# Altium footprint library SAMTEC THD.PcbLib: 161 footprints (part 10 of 12)
Each footprint in its own frame and in the unit in brackets; x right, y up, seen from the top. Pads: shape width x height; smd on the part's side, far side on the other; paste and mask are expansions set on the pad; w line width, h text height; cw(c..) or ccw(c..) is an arc to the next point about the centre after c.
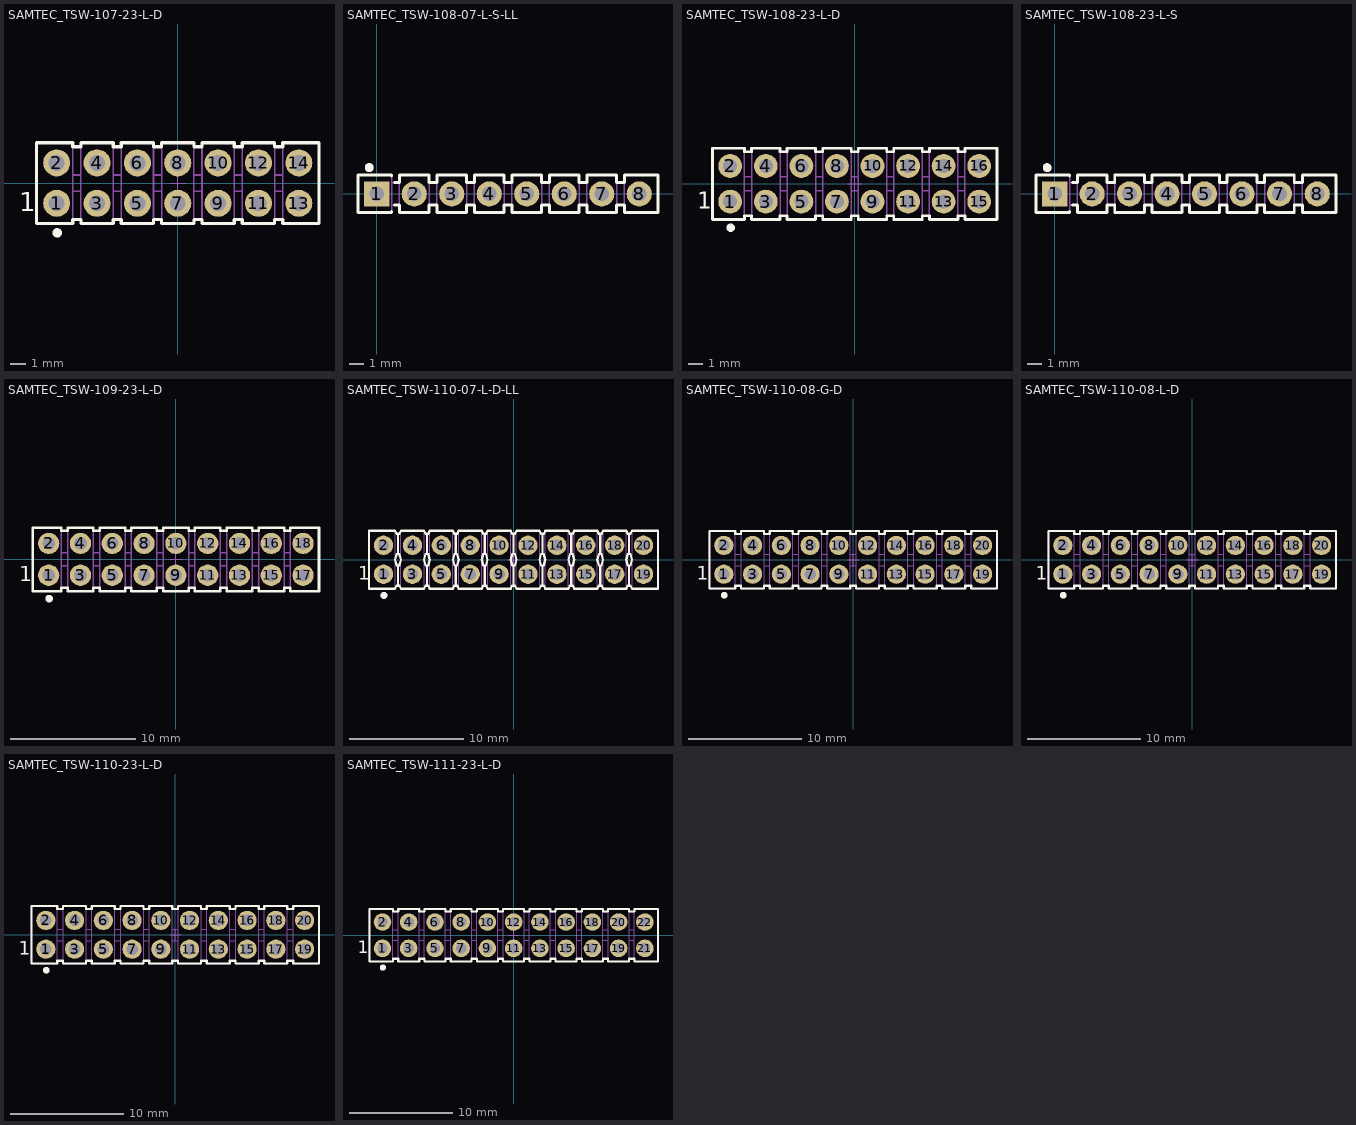
[diagram p9: the footprints below, top view; thin cyan lines are the x and y axes]

## SAMTEC_TSW-107-23-L-D [mm] "14 Contacts - Pitch 2.54mm - Dual Row  Through Mount Straigh Header (Post Lead 5.84mm, Tail Lead 2.92mm, Insulator 2.54mm)"
height 8.38
pads (14):
  round 1.7 hole 1: 1(-7.62,-1.27) 2(-7.62,1.27) 3(-5.08,-1.27) 4(-5.08,1.27) 5(-2.54,-1.27) 6(-2.54,1.27) 7(0,-1.27) 8(0,1.27) 9(2.54,-1.27) 10(2.54,1.27) 11(5.08,-1.27) 12(5.08,1.27) 13(7.62,-1.27) 14(7.62,1.27)
Top Overlay:
  circle w0.3: c-7.585,-3.135 r0.15
  lines w0.2: -8.89,-2.54 -6.604,-2.54 -6.604,-2.286 -6.096,-2.286 -6.096,-2.54 -4.064,-2.54 -4.064,-2.286 -3.556,-2.286 -3.556,-2.54 -1.524,-2.54 -1.524,-2.286 -1.016,-2.286 -1.016,-2.54 1.016,-2.54 1.016,-2.286 1.524,-2.286 1.524,-2.54 3.556,-2.54 3.556,-2.286 4.064,-2.286 4.064,-2.54 6.096,-2.54 6.096,-2.286 6.604,-2.286 6.604,-2.54 8.89,-2.54 8.89,2.54 6.604,2.54 6.604,2.286 6.096,2.286 6.096,2.54 4.064,2.54 4.064,2.286 3.556,2.286 3.556,2.54 1.524,2.54 1.524,2.286 1.016,2.286 1.016,2.54 -1.016,2.54 -1.016,2.286 -1.524,2.286 -1.524,2.54 -3.556,2.54 -3.556,2.286 -4.064,2.286 -4.064,2.54 -6.096,2.54 -6.096,2.286 -6.604,2.286 -6.604,2.54 -8.89,2.54 -8.89,-2.54
  text "1" at -9.992,-1.768 h1.2
Mechanical 8:
  lines w0.05: -8.12,-1.27 -7.62,-1.27 ; -8.12,1.27 -7.62,1.27 ; -7.62,-1.77 -7.62,-1.27 ; -7.62,-0.77 -7.62,-1.27 ; -7.62,0.77 -7.62,1.27 ; -7.62,1.77 -7.62,1.27 ; -7.12,-1.27 -7.62,-1.27 ; -7.12,1.27 -7.62,1.27 ; -5.58,-1.27 -5.08,-1.27 ; -5.58,1.27 -5.08,1.27 ; -5.08,-1.77 -5.08,-1.27 ; -5.08,-0.77 -5.08,-1.27 ; -5.08,0.77 -5.08,1.27 ; -5.08,1.77 -5.08,1.27 ; -4.58,-1.27 -5.08,-1.27 ; -4.58,1.27 -5.08,1.27 ; -3.04,-1.27 -2.54,-1.27 ; -3.04,1.27 -2.54,1.27 ; -2.54,-1.77 -2.54,-1.27 ; -2.54,-0.77 -2.54,-1.27 ; -2.54,0.77 -2.54,1.27 ; -2.54,1.77 -2.54,1.27 ; -2.04,-1.27 -2.54,-1.27 ; -2.04,1.27 -2.54,1.27 ; -0.5,-1.27 0,-1.27 ; -0.5,0 0,0 ; -0.5,1.27 0,1.27 ; 0,-1.77 0,-1.27 ; 0,-0.77 0,-1.27 ; 0,-0.5 0,0 ; 0,0.5 0,0 ; 0,0.77 0,1.27 ; 0,1.77 0,1.27 ; 0.5,-1.27 0,-1.27 ; 0.5,0 0,0 ; 0.5,1.27 0,1.27 ; 2.04,-1.27 2.54,-1.27 ; 2.04,1.27 2.54,1.27 ; 2.54,-1.77 2.54,-1.27 ; 2.54,-0.77 2.54,-1.27 ; 2.54,0.77 2.54,1.27 ; 2.54,1.77 2.54,1.27 ; 3.04,-1.27 2.54,-1.27 ; 3.04,1.27 2.54,1.27 ; 4.58,-1.27 5.08,-1.27 ; 4.58,1.27 5.08,1.27 ; 5.08,-1.77 5.08,-1.27 ; 5.08,-0.77 5.08,-1.27 ; 5.08,0.77 5.08,1.27 ; 5.08,1.77 5.08,1.27 ; 5.58,-1.27 5.08,-1.27 ; 5.58,1.27 5.08,1.27 ; 7.12,-1.27 7.62,-1.27 ; 7.12,1.27 7.62,1.27 ; 7.62,-1.77 7.62,-1.27 ; 7.62,-0.77 7.62,-1.27 ; 7.62,0.77 7.62,1.27 ; 7.62,1.77 7.62,1.27 ; 8.12,-1.27 7.62,-1.27 ; 8.12,1.27 7.62,1.27
Mechanical 14:
  lines w0.1: -6.604,-2.286 -6.096,-2.286 ; -6.604,-0.508 -6.096,-0.508 ; -6.604,0.508 -6.096,0.508 ; -6.604,2.286 -6.096,2.286 ; -4.064,-2.286 -3.556,-2.286 ; -4.064,-0.508 -3.556,-0.508 ; -4.064,0.508 -3.556,0.508 ; -4.064,2.286 -3.556,2.286 ; -1.524,-2.286 -1.016,-2.286 ; -1.524,-0.508 -1.016,-0.508 ; -1.524,0.508 -1.016,0.508 ; -1.524,2.286 -1.016,2.286 ; 1.016,-2.286 1.524,-2.286 ; 1.016,-0.508 1.524,-0.508 ; 1.016,0.508 1.524,0.508 ; 1.016,2.286 1.524,2.286 ; 3.556,-2.286 4.064,-2.286 ; 3.556,-0.508 4.064,-0.508 ; 3.556,0.508 4.064,0.508 ; 3.556,2.286 4.064,2.286 ; 6.096,-2.286 6.604,-2.286 ; 6.096,-0.508 6.604,-0.508 ; 6.096,0.508 6.604,0.508 ; 6.096,2.286 6.604,2.286 ; -8.89,-2.54 -8.89,2.54 -6.604,2.54 -6.604,-2.54 -8.89,-2.54 ; -6.096,-2.54 -6.096,2.54 -4.064,2.54 -4.064,-2.54 -6.096,-2.54 ; -3.556,-2.54 -3.556,2.54 -1.524,2.54 -1.524,-2.54 -3.556,-2.54 ; -1.016,-2.54 -1.016,2.54 1.016,2.54 1.016,-2.54 -1.016,-2.54 ; 1.524,-2.54 1.524,2.54 3.556,2.54 3.556,-2.54 1.524,-2.54 ; 4.064,-2.54 4.064,2.54 6.096,2.54 6.096,-2.54 4.064,-2.54 ; 6.604,-2.54 6.604,2.54 8.89,2.54 8.89,-2.54 6.604,-2.54
3D body "SAMTEC_TSW-107-23-L-D.stp": height 8.38, standoff -2.92, extent -8.89,-2.54 8.89,2.54

## SAMTEC_TSW-108-07-L-S-LL [mm] "8 Contacts - Pitch 2.54mm - Single Row  Through Mount Straigh Header (Post Lead 5.84mm, Tail Lead 2.54mm, Insulator 2.54mm)"
height 8.38
pads (8):
  rect 1.7x1.7 hole 1: 1(0,0)
  round 1.7 hole 1: 2(2.54,0) 3(5.08,0) 4(7.62,0) 5(10.16,0) 6(12.7,0) 7(15.24,0) 8(17.78,0)
Top Overlay:
  circle w0.3: c-0.508,1.778 r0.15
  lines w0.2: 1.007,-1.2 1.007,-1.27 -1.27,-1.27 -1.27,1.27 1.007,1.27 1.007,1.2 ; 1.2,-0.762 1.533,-0.762 1.533,-1.27 3.547,-1.27 3.547,-0.762 4.073,-0.762 4.073,-1.27 6.087,-1.27 6.087,-0.762 6.613,-0.762 6.613,-1.27 8.627,-1.27 8.627,-0.762 9.153,-0.762 9.153,-1.27 11.167,-1.27 11.167,-0.762 11.693,-0.762 11.693,-1.27 13.707,-1.27 13.707,-0.762 14.233,-0.762 14.233,-1.27 16.247,-1.27 16.247,-0.762 ; 1.2,0.762 1.533,0.762 1.533,1.27 3.547,1.27 3.547,0.762 4.073,0.762 4.073,1.27 6.087,1.27 6.087,0.762 6.613,0.762 6.613,1.27 8.627,1.27 8.627,0.762 9.153,0.762 9.153,1.27 11.167,1.27 11.167,0.762 11.693,0.762 11.693,1.27 13.707,1.27 13.707,0.762 14.233,0.762 14.233,1.27 16.247,1.27 16.247,0.762 ; 16.247,-0.762 16.773,-0.762 ; 16.247,-0.762 16.773,-0.762 ; 16.247,0.762 16.773,0.762 ; 16.247,0.762 16.773,0.762 ; 16.773,-0.762 16.773,-1.27 19.05,-1.27 19.05,1.27 16.773,1.27 16.773,0.762
Mechanical 8:
  lines w0.1: -0.5,0 0,0 ; 0,-0.5 0,0 ; 0,0.5 0,0 ; 0.5,0 0,0 ; 2.04,0 2.54,0 ; 2.54,-0.5 2.54,0 ; 2.54,0.5 2.54,0 ; 3.04,0 2.54,0 ; 4.58,0 5.08,0 ; 5.08,-0.5 5.08,0 ; 5.08,0.5 5.08,0 ; 5.58,0 5.08,0 ; 7.12,0 7.62,0 ; 7.62,-0.5 7.62,0 ; 7.62,0.5 7.62,0 ; 8.12,0 7.62,0 ; 9.66,0 10.16,0 ; 10.16,-0.5 10.16,0 ; 10.16,0.5 10.16,0 ; 10.66,0 10.16,0 ; 12.2,0 12.7,0 ; 12.7,-0.5 12.7,0 ; 12.7,0.5 12.7,0 ; 13.2,0 12.7,0 ; 14.74,0 15.24,0 ; 15.24,-0.5 15.24,0 ; 15.24,0.5 15.24,0 ; 15.74,0 15.24,0 ; 17.28,0 17.78,0 ; 17.78,-0.5 17.78,0 ; 17.78,0.5 17.78,0 ; 18.28,0 17.78,0
Mechanical 14:
  circle w0.3: c-0.508,1.778 r0.15
  lines w0.1: 1.007,-0.762 1.533,-0.762 ; 1.007,0.762 1.533,0.762 ; 3.547,-0.762 4.073,-0.762 ; 3.547,0.762 4.073,0.762 ; 6.087,-0.762 6.613,-0.762 ; 6.087,0.762 6.613,0.762 ; 8.627,-0.762 9.153,-0.762 ; 8.627,0.762 9.153,0.762 ; 11.167,-0.762 11.693,-0.762 ; 11.167,0.762 11.693,0.762 ; 13.707,-0.762 14.233,-0.762 ; 13.707,0.762 14.233,0.762 ; -1.27,-1.27 -1.27,1.27 1.007,1.27 1.007,-1.27 -1.27,-1.27 ; -0.317,-0.318 -0.318,0.317 0.317,0.317 0.318,-0.317 -0.317,-0.318 ; 1.533,-1.27 3.547,-1.27 3.547,1.27 1.533,1.27 1.533,-1.27 ; 2.223,-0.318 2.222,0.317 2.857,0.317 2.858,-0.317 2.223,-0.318 ; 4.073,-1.27 4.073,1.27 6.087,1.27 6.087,-1.27 4.073,-1.27 ; 4.763,-0.318 5.398,-0.318 5.397,0.317 4.763,0.317 4.763,-0.318 ; 6.613,-1.27 6.613,1.27 8.627,1.27 8.627,-1.27 6.613,-1.27 ; 7.303,-0.318 7.938,-0.318 7.937,0.317 7.303,0.317 7.303,-0.318 ; 9.153,-1.27 9.153,1.27 11.167,1.27 11.167,-1.27 9.153,-1.27 ; 9.843,-0.318 10.478,-0.318 10.477,0.317 9.843,0.317 9.843,-0.318 ; 11.693,-1.27 11.693,1.27 13.707,1.27 13.707,-1.27 11.693,-1.27 ; 12.383,-0.318 13.018,-0.318 13.017,0.317 12.383,0.317 12.383,-0.318 ; 14.233,-1.27 14.233,1.27 16.247,1.27 16.247,-1.27 14.233,-1.27 ; 14.923,-0.318 14.923,0.317 15.557,0.317 15.558,-0.317 14.923,-0.318 ; 16.247,-0.762 16.773,-0.762 16.247,-0.762 ; 16.247,0.762 16.773,0.762 16.247,0.762 ; 16.773,-1.27 16.773,1.27 19.05,1.27 19.05,-1.27 16.773,-1.27 ; 17.463,-0.318 17.463,0.317 18.098,0.317 18.098,-0.318 17.463,-0.318
3D body "SAMTEC_TSW-108-07-L-S-LL.stp": height 8.38, standoff -2.54, extent -1.27,-1.27 19.05,1.27

## SAMTEC_TSW-108-23-L-D [mm] "16 Contacts - Pitch 2.54mm - Dual Row  Through Mount Straigh Header (Post Lead 5.84mm, Tail Lead 2.92mm, Insulator 2.54mm)"
height 8.38
pads (16):
  round 1.7 hole 1: 1(-8.89,-1.27) 2(-8.89,1.27) 3(-6.35,-1.27) 4(-6.35,1.27) 5(-3.81,-1.27) 6(-3.81,1.27) 7(-1.27,-1.27) 8(-1.27,1.27) 9(1.27,-1.27) 10(1.27,1.27) 11(3.81,-1.27) 12(3.81,1.27) 13(6.35,-1.27) 14(6.35,1.27) 15(8.89,-1.27) 16(8.89,1.27)
Top Overlay:
  circle w0.3: c-8.855,-3.135 r0.15
  lines w0.2: -10.16,-2.54 -7.874,-2.54 -7.874,-2.286 -7.366,-2.286 -7.366,-2.54 -5.334,-2.54 -5.334,-2.286 -4.826,-2.286 -4.826,-2.54 -2.794,-2.54 -2.794,-2.286 -2.286,-2.286 -2.286,-2.54 -0.254,-2.54 -0.254,-2.286 0.254,-2.286 0.254,-2.54 2.286,-2.54 2.286,-2.286 2.794,-2.286 2.794,-2.54 4.826,-2.54 4.826,-2.286 5.334,-2.286 5.334,-2.54 7.366,-2.54 7.366,-2.286 7.874,-2.286 7.874,-2.54 10.16,-2.54 10.16,2.54 7.874,2.54 7.874,2.286 7.366,2.286 7.366,2.54 5.334,2.54 5.334,2.286 4.826,2.286 4.826,2.54 2.794,2.54 2.794,2.286 2.286,2.286 2.286,2.54 0.254,2.54 0.254,2.286 -0.254,2.286 -0.254,2.54 -2.286,2.54 -2.286,2.286 -2.794,2.286 -2.794,2.54 -4.826,2.54 -4.826,2.286 -5.334,2.286 -5.334,2.54 -7.366,2.54 -7.366,2.286 -7.874,2.286 -7.874,2.54 -10.16,2.54 -10.16,-2.54
  text "1" at -11.262,-1.768 h1.2
Mechanical 8:
  lines w0.05: -9.39,-1.27 -8.89,-1.27 ; -9.39,1.27 -8.89,1.27 ; -8.89,-1.77 -8.89,-1.27 ; -8.89,-0.77 -8.89,-1.27 ; -8.89,0.77 -8.89,1.27 ; -8.89,1.77 -8.89,1.27 ; -8.39,-1.27 -8.89,-1.27 ; -8.39,1.27 -8.89,1.27 ; -6.85,-1.27 -6.35,-1.27 ; -6.85,1.27 -6.35,1.27 ; -6.35,-1.77 -6.35,-1.27 ; -6.35,-0.77 -6.35,-1.27 ; -6.35,0.77 -6.35,1.27 ; -6.35,1.77 -6.35,1.27 ; -5.85,-1.27 -6.35,-1.27 ; -5.85,1.27 -6.35,1.27 ; -4.31,-1.27 -3.81,-1.27 ; -4.31,1.27 -3.81,1.27 ; -3.81,-1.77 -3.81,-1.27 ; -3.81,-0.77 -3.81,-1.27 ; -3.81,0.77 -3.81,1.27 ; -3.81,1.77 -3.81,1.27 ; -3.31,-1.27 -3.81,-1.27 ; -3.31,1.27 -3.81,1.27 ; -1.77,-1.27 -1.27,-1.27 ; -1.77,1.27 -1.27,1.27 ; -1.27,-1.77 -1.27,-1.27 ; -1.27,-0.77 -1.27,-1.27 ; -1.27,0.77 -1.27,1.27 ; -1.27,1.77 -1.27,1.27 ; -0.77,-1.27 -1.27,-1.27 ; -0.77,1.27 -1.27,1.27 ; -0.5,0 0,0 ; 0,-0.5 0,0 ; 0,0.5 0,0 ; 0.5,0 0,0 ; 0.77,-1.27 1.27,-1.27 ; 0.77,1.27 1.27,1.27 ; 1.27,-1.77 1.27,-1.27 ; 1.27,-0.77 1.27,-1.27 ; 1.27,0.77 1.27,1.27 ; 1.27,1.77 1.27,1.27 ; 1.77,-1.27 1.27,-1.27 ; 1.77,1.27 1.27,1.27 ; 3.31,-1.27 3.81,-1.27 ; 3.31,1.27 3.81,1.27 ; 3.81,-1.77 3.81,-1.27 ; 3.81,-0.77 3.81,-1.27 ; 3.81,0.77 3.81,1.27 ; 3.81,1.77 3.81,1.27 ; 4.31,-1.27 3.81,-1.27 ; 4.31,1.27 3.81,1.27 ; 5.85,-1.27 6.35,-1.27 ; 5.85,1.27 6.35,1.27 ; 6.35,-1.77 6.35,-1.27 ; 6.35,-0.77 6.35,-1.27 ; 6.35,0.77 6.35,1.27 ; 6.35,1.77 6.35,1.27 ; 6.85,-1.27 6.35,-1.27 ; 6.85,1.27 6.35,1.27 ; 8.39,-1.27 8.89,-1.27 ; 8.39,1.27 8.89,1.27 ; 8.89,-1.77 8.89,-1.27 ; 8.89,-0.77 8.89,-1.27 ; 8.89,0.77 8.89,1.27 ; 8.89,1.77 8.89,1.27 ; 9.39,-1.27 8.89,-1.27 ; 9.39,1.27 8.89,1.27
Mechanical 14:
  lines w0.1: -7.874,-2.286 -7.366,-2.286 ; -7.874,-0.508 -7.366,-0.508 ; -7.874,0.508 -7.366,0.508 ; -7.874,2.286 -7.366,2.286 ; -5.334,-2.286 -4.826,-2.286 ; -5.334,-0.508 -4.826,-0.508 ; -5.334,0.508 -4.826,0.508 ; -5.334,2.286 -4.826,2.286 ; -2.794,-2.286 -2.286,-2.286 ; -2.794,-0.508 -2.286,-0.508 ; -2.794,0.508 -2.286,0.508 ; -2.794,2.286 -2.286,2.286 ; -0.254,-2.286 0.254,-2.286 ; -0.254,-0.508 0.254,-0.508 ; -0.254,0.508 0.254,0.508 ; -0.254,2.286 0.254,2.286 ; 2.286,-2.286 2.794,-2.286 ; 2.286,-0.508 2.794,-0.508 ; 2.286,0.508 2.794,0.508 ; 2.286,2.286 2.794,2.286 ; 4.826,-2.286 5.334,-2.286 ; 4.826,-0.508 5.334,-0.508 ; 4.826,0.508 5.334,0.508 ; 4.826,2.286 5.334,2.286 ; 7.366,-2.286 7.874,-2.286 ; 7.366,-0.508 7.874,-0.508 ; 7.366,0.508 7.874,0.508 ; 7.366,2.286 7.874,2.286 ; -10.16,-2.54 -10.16,2.54 -7.874,2.54 -7.874,-2.54 -10.16,-2.54 ; -7.366,-2.54 -7.366,2.54 -5.334,2.54 -5.334,-2.54 -7.366,-2.54 ; -4.826,-2.54 -4.826,2.54 -2.794,2.54 -2.794,-2.54 -4.826,-2.54 ; -2.286,-2.54 -2.286,2.54 -0.254,2.54 -0.254,-2.54 -2.286,-2.54 ; 0.254,-2.54 0.254,2.54 2.286,2.54 2.286,-2.54 0.254,-2.54 ; 2.794,-2.54 2.794,2.54 4.826,2.54 4.826,-2.54 2.794,-2.54 ; 5.334,-2.54 5.334,2.54 7.366,2.54 7.366,-2.54 5.334,-2.54 ; 7.874,-2.54 7.874,2.54 10.16,2.54 10.16,-2.54 7.874,-2.54
3D body "SAMTEC_TSW-108-23-L-D.stp": height 8.38, standoff -2.92, extent -10.16,-2.54 10.16,2.54

## SAMTEC_TSW-108-23-L-S [mm] "8 Contacts - Pitch 2.54mm - Single Row  Through Mount Straigh Header (Post Lead 5.84mm, Tail Lead 2.92mm, Insulator 2.54mm)"
height 8.38
pads (8):
  rect 1.7x1.7 hole 1: 1(0,0)
  round 1.7 hole 1: 2(2.54,0) 3(5.08,0) 4(7.62,0) 5(10.16,0) 6(12.7,0) 7(15.24,0) 8(17.81,0)
Top Overlay:
  circle w0.3: c-0.508,1.778 r0.15
  lines w0.2: 1.007,-1.2 1.007,-1.27 -1.27,-1.27 -1.27,1.27 1.007,1.27 1.007,1.2 ; 1.2,-0.762 1.533,-0.762 1.533,-1.27 3.547,-1.27 3.547,-0.762 4.073,-0.762 4.073,-1.27 6.087,-1.27 6.087,-0.762 ; 1.2,0.762 1.533,0.762 1.533,1.27 3.547,1.27 3.547,0.762 4.073,0.762 4.073,1.27 6.087,1.27 6.087,0.762 ; 16.803,-0.762 16.803,-1.27 19.08,-1.27 19.08,1.27 16.803,1.27 16.803,0.762 ; 6.087,-0.762 6.613,-0.762 ; 6.087,-0.762 6.613,-0.762 ; 6.087,0.762 6.613,0.762 ; 6.087,0.762 6.613,0.762 ; 6.613,-0.762 6.613,-1.27 8.627,-1.27 8.627,-0.762 ; 6.613,0.762 6.613,1.27 8.627,1.27 8.627,0.762 ; 8.627,-0.762 9.153,-0.762 ; 8.627,-0.762 9.153,-0.762 ; 8.627,0.762 9.153,0.762 ; 8.627,0.762 9.153,0.762 ; 9.153,-0.762 9.153,-1.27 11.167,-1.27 11.167,-0.762 ; 9.153,0.762 9.153,1.27 11.167,1.27 11.167,0.762 ; 11.167,-0.762 11.693,-0.762 ; 11.167,-0.762 11.693,-0.762 ; 11.167,0.762 11.693,0.762 ; 11.167,0.762 11.693,0.762 ; 11.693,-0.762 11.693,-1.27 13.707,-1.27 13.707,-0.762 ; 11.693,0.762 11.693,1.27 13.707,1.27 13.707,0.762 ; 13.707,-0.762 14.233,-0.762 ; 13.707,-0.762 14.233,-0.762 ; 13.707,0.762 14.233,0.762 ; 13.707,0.762 14.233,0.762 ; 14.233,-0.762 14.233,-1.27 16.247,-1.27 16.247,-0.762 ; 14.233,0.762 14.233,1.27 16.247,1.27 16.247,0.762 ; 16.247,-0.762 16.773,-0.762 16.247,-0.762 ; 16.247,0.762 16.773,0.762 16.247,0.762
Mechanical 8:
  lines w0.1: -0.5,0 0,0 ; 0,-0.5 0,0 ; 0,0.5 0,0 ; 0.5,0 0,0 ; 2.04,0 2.54,0 ; 2.54,-0.5 2.54,0 ; 2.54,0.5 2.54,0 ; 3.04,0 2.54,0 ; 4.58,0 5.08,0 ; 5.08,-0.5 5.08,0 ; 5.08,0.5 5.08,0 ; 5.58,0 5.08,0 ; 7.12,0 7.62,0 ; 7.62,-0.5 7.62,0 ; 7.62,0.5 7.62,0 ; 8.12,0 7.62,0 ; 9.66,0 10.16,0 ; 10.16,-0.5 10.16,0 ; 10.16,0.5 10.16,0 ; 10.66,0 10.16,0 ; 12.2,0 12.7,0 ; 12.7,-0.5 12.7,0 ; 12.7,0.5 12.7,0 ; 13.2,0 12.7,0 ; 14.74,0 15.24,0 ; 15.24,-0.5 15.24,0 ; 15.24,0.5 15.24,0 ; 15.74,0 15.24,0 ; 17.31,0 17.81,0 ; 17.81,-0.5 17.81,0 ; 17.81,0.5 17.81,0 ; 18.31,0 17.81,0
Mechanical 14:
  circle w0.3: c-0.508,1.778 r0.15
  lines w0.1: 1.007,-0.762 1.533,-0.762 ; 1.007,0.762 1.533,0.762 ; 3.547,-0.762 4.073,-0.762 ; 3.547,0.762 4.073,0.762 ; -1.27,-1.27 -1.27,1.27 1.007,1.27 1.007,-1.27 -1.27,-1.27 ; -0.317,-0.318 -0.318,0.317 0.317,0.317 0.318,-0.317 -0.317,-0.318 ; 1.533,-1.27 3.547,-1.27 3.547,1.27 1.533,1.27 1.533,-1.27 ; 2.223,-0.318 2.222,0.317 2.857,0.317 2.858,-0.317 2.223,-0.318 ; 4.073,-1.27 4.073,1.27 6.087,1.27 6.087,-1.27 4.073,-1.27 ; 4.763,-0.318 4.763,0.317 5.397,0.317 5.398,-0.317 4.763,-0.318 ; 6.087,-0.762 6.613,-0.762 6.087,-0.762 ; 6.087,0.762 6.613,0.762 6.087,0.762 ; 6.613,-1.27 8.627,-1.27 8.627,1.27 6.613,1.27 6.613,-1.27 ; 7.303,-0.318 7.938,-0.318 7.937,0.317 7.302,0.317 7.303,-0.318 ; 8.627,-0.762 9.153,-0.762 8.627,-0.762 ; 8.627,0.762 9.153,0.762 8.627,0.762 ; 9.153,-1.27 11.167,-1.27 11.167,1.27 9.153,1.27 9.153,-1.27 ; 9.843,-0.318 10.478,-0.318 10.477,0.317 9.842,0.317 9.843,-0.318 ; 11.167,-0.762 11.693,-0.762 11.167,-0.762 ; 11.167,0.762 11.693,0.762 11.167,0.762 ; 11.693,-1.27 13.707,-1.27 13.707,1.27 11.693,1.27 11.693,-1.27 ; 12.383,-0.318 13.018,-0.318 13.017,0.317 12.383,0.317 12.383,-0.318 ; 13.707,-0.762 14.233,-0.762 13.707,-0.762 ; 13.707,0.762 14.233,0.762 13.707,0.762 ; 14.233,-1.27 16.247,-1.27 16.247,1.27 14.233,1.27 14.233,-1.27 ; 14.923,-0.318 15.558,-0.318 15.557,0.317 14.922,0.317 14.923,-0.318 ; 16.247,-0.762 16.773,-0.762 16.247,-0.762 ; 16.247,0.762 16.773,0.762 16.247,0.762 ; 16.803,-1.27 19.08,-1.27 19.08,1.27 16.803,1.27 16.803,-1.27 ; 17.493,-0.318 18.128,-0.318 18.128,0.317 17.493,0.317 17.493,-0.318
3D body "SAMTEC_TSW-108-23-L-S.stp": height 8.38, standoff -2.92, extent -1.27,-1.27 19.05,1.27

## SAMTEC_TSW-109-23-L-D [mm] "18 Contacts - Pitch 2.54mm - Dual Row  Through Mount Straigh Header (Post Lead 5.84mm, Tail Lead 2.92mm, Insulator 2.54mm)"
height 8.38
pads (18):
  round 1.7 hole 1: 1(-10.16,-1.27) 2(-10.16,1.27) 3(-7.62,-1.27) 4(-7.62,1.27) 5(-5.08,-1.27) 6(-5.08,1.27) 7(-2.54,-1.27) 8(-2.54,1.27) 9(0,-1.27) 10(0,1.27) 11(2.54,-1.27) 12(2.54,1.27) 13(5.08,-1.27) 14(5.08,1.27) 15(7.62,-1.27) 16(7.62,1.27) 17(10.16,-1.27) 18(10.16,1.27)
Top Overlay:
  circle w0.3: c-10.125,-3.135 r0.15
  lines w0.2: -11.43,-2.54 -9.144,-2.54 -9.144,-2.286 -8.636,-2.286 -8.636,-2.54 -6.604,-2.54 -6.604,-2.286 -6.096,-2.286 -6.096,-2.54 -4.064,-2.54 -4.064,-2.286 -3.556,-2.286 -3.556,-2.54 -1.524,-2.54 -1.524,-2.286 -1.016,-2.286 -1.016,-2.54 1.016,-2.54 1.016,-2.286 1.524,-2.286 1.524,-2.54 3.556,-2.54 3.556,-2.286 4.064,-2.286 4.064,-2.54 6.096,-2.54 6.096,-2.286 6.604,-2.286 6.604,-2.54 8.636,-2.54 8.636,-2.286 9.144,-2.286 9.144,-2.54 11.43,-2.54 11.43,2.54 9.144,2.54 9.144,2.286 8.636,2.286 8.636,2.54 6.604,2.54 6.604,2.286 6.096,2.286 6.096,2.54 4.064,2.54 4.064,2.286 3.556,2.286 3.556,2.54 1.524,2.54 1.524,2.286 1.016,2.286 1.016,2.54 -1.016,2.54 -1.016,2.286 -1.524,2.286 -1.524,2.54 -3.556,2.54 -3.556,2.286 -4.064,2.286 -4.064,2.54 -6.096,2.54 -6.096,2.286 -6.604,2.286 -6.604,2.54 -8.636,2.54 -8.636,2.286 -9.144,2.286 -9.144,2.54 -11.43,2.54 -11.43,-2.54
  text "1" at -12.532,-1.768 h1.2
Mechanical 8:
  lines w0.05: -10.66,-1.27 -10.16,-1.27 ; -10.66,1.27 -10.16,1.27 ; -10.16,-1.77 -10.16,-1.27 ; -10.16,-0.77 -10.16,-1.27 ; -10.16,0.77 -10.16,1.27 ; -10.16,1.77 -10.16,1.27 ; -9.66,-1.27 -10.16,-1.27 ; -9.66,1.27 -10.16,1.27 ; -8.12,-1.27 -7.62,-1.27 ; -8.12,1.27 -7.62,1.27 ; -7.62,-1.77 -7.62,-1.27 ; -7.62,-0.77 -7.62,-1.27 ; -7.62,0.77 -7.62,1.27 ; -7.62,1.77 -7.62,1.27 ; -7.12,-1.27 -7.62,-1.27 ; -7.12,1.27 -7.62,1.27 ; -5.58,-1.27 -5.08,-1.27 ; -5.58,1.27 -5.08,1.27 ; -5.08,-1.77 -5.08,-1.27 ; -5.08,-0.77 -5.08,-1.27 ; -5.08,0.77 -5.08,1.27 ; -5.08,1.77 -5.08,1.27 ; -4.58,-1.27 -5.08,-1.27 ; -4.58,1.27 -5.08,1.27 ; -3.04,-1.27 -2.54,-1.27 ; -3.04,1.27 -2.54,1.27 ; -2.54,-1.77 -2.54,-1.27 ; -2.54,-0.77 -2.54,-1.27 ; -2.54,0.77 -2.54,1.27 ; -2.54,1.77 -2.54,1.27 ; -2.04,-1.27 -2.54,-1.27 ; -2.04,1.27 -2.54,1.27 ; -0.5,-1.27 0,-1.27 ; -0.5,0 0,0 ; -0.5,1.27 0,1.27 ; 0,-1.77 0,-1.27 ; 0,-0.77 0,-1.27 ; 0,-0.5 0,0 ; 0,0.5 0,0 ; 0,0.77 0,1.27 ; 0,1.77 0,1.27 ; 0.5,-1.27 0,-1.27 ; 0.5,0 0,0 ; 0.5,1.27 0,1.27 ; 2.04,-1.27 2.54,-1.27 ; 2.04,1.27 2.54,1.27 ; 2.54,-1.77 2.54,-1.27 ; 2.54,-0.77 2.54,-1.27 ; 2.54,0.77 2.54,1.27 ; 2.54,1.77 2.54,1.27 ; 3.04,-1.27 2.54,-1.27 ; 3.04,1.27 2.54,1.27 ; 4.58,-1.27 5.08,-1.27 ; 4.58,1.27 5.08,1.27 ; 5.08,-1.77 5.08,-1.27 ; 5.08,-0.77 5.08,-1.27 ; 5.08,0.77 5.08,1.27 ; 5.08,1.77 5.08,1.27 ; 5.58,-1.27 5.08,-1.27 ; 5.58,1.27 5.08,1.27 ; 7.12,-1.27 7.62,-1.27 ; 7.12,1.27 7.62,1.27 ; 7.62,-1.77 7.62,-1.27 ; 7.62,-0.77 7.62,-1.27 ; 7.62,0.77 7.62,1.27 ; 7.62,1.77 7.62,1.27 ; 8.12,-1.27 7.62,-1.27 ; 8.12,1.27 7.62,1.27 ; 9.66,-1.27 10.16,-1.27 ; 9.66,1.27 10.16,1.27 ; 10.16,-1.77 10.16,-1.27 ; 10.16,-0.77 10.16,-1.27 ; 10.16,0.77 10.16,1.27 ; 10.16,1.77 10.16,1.27 ; 10.66,-1.27 10.16,-1.27 ; 10.66,1.27 10.16,1.27
Mechanical 14:
  lines w0.1: -9.144,-2.286 -8.636,-2.286 ; -9.144,-0.508 -8.636,-0.508 ; -9.144,0.508 -8.636,0.508 ; -9.144,2.286 -8.636,2.286 ; -6.604,-2.286 -6.096,-2.286 ; -6.604,-0.508 -6.096,-0.508 ; -6.604,0.508 -6.096,0.508 ; -6.604,2.286 -6.096,2.286 ; -4.064,-2.286 -3.556,-2.286 ; -4.064,-0.508 -3.556,-0.508 ; -4.064,0.508 -3.556,0.508 ; -4.064,2.286 -3.556,2.286 ; -1.524,-2.286 -1.016,-2.286 ; -1.524,-0.508 -1.016,-0.508 ; -1.524,0.508 -1.016,0.508 ; -1.524,2.286 -1.016,2.286 ; 1.016,-2.286 1.524,-2.286 ; 1.016,-0.508 1.524,-0.508 ; 1.016,0.508 1.524,0.508 ; 1.016,2.286 1.524,2.286 ; 3.556,-2.286 4.064,-2.286 ; 3.556,-0.508 4.064,-0.508 ; 3.556,0.508 4.064,0.508 ; 3.556,2.286 4.064,2.286 ; 6.096,-2.286 6.604,-2.286 ; 6.096,-0.508 6.604,-0.508 ; 6.096,0.508 6.604,0.508 ; 6.096,2.286 6.604,2.286 ; 8.636,-2.286 9.144,-2.286 ; 8.636,-0.508 9.144,-0.508 ; 8.636,0.508 9.144,0.508 ; 8.636,2.286 9.144,2.286 ; -11.43,-2.54 -11.43,2.54 -9.144,2.54 -9.144,-2.54 -11.43,-2.54 ; -8.636,-2.54 -8.636,2.54 -6.604,2.54 -6.604,-2.54 -8.636,-2.54 ; -6.096,-2.54 -6.096,2.54 -4.064,2.54 -4.064,-2.54 -6.096,-2.54 ; -3.556,-2.54 -3.556,2.54 -1.524,2.54 -1.524,-2.54 -3.556,-2.54 ; -1.016,-2.54 -1.016,2.54 1.016,2.54 1.016,-2.54 -1.016,-2.54 ; 1.524,-2.54 1.524,2.54 3.556,2.54 3.556,-2.54 1.524,-2.54 ; 4.064,-2.54 4.064,2.54 6.096,2.54 6.096,-2.54 4.064,-2.54 ; 6.604,-2.54 6.604,2.54 8.636,2.54 8.636,-2.54 6.604,-2.54 ; 9.144,-2.54 9.144,2.54 11.43,2.54 11.43,-2.54 9.144,-2.54
3D body "SAMTEC_TSW-109-23-L-D.stp": height 8.38, standoff -2.92, extent -11.43,-2.54 11.43,2.54

## SAMTEC_TSW-110-07-L-D-LL [mm] "20 Contacts, Pitch 2.54mm - Dual Row, Through Mount Straigh Header"
height 8.38
pads (20):
  round 1.7 hole 1: 1(-11.43,-1.27) 2(-11.43,1.27) 3(-8.89,-1.27) 4(-8.89,1.27) 5(-6.35,-1.27) 6(-6.35,1.27) 7(-3.81,-1.27) 8(-3.81,1.27) 9(-1.27,-1.27) 10(-1.27,1.27) 11(1.27,-1.27) 12(1.27,1.27) 13(3.81,-1.27) 14(3.81,1.27) 15(6.35,-1.27) 16(6.35,1.27) 17(8.89,-1.27) 18(8.89,1.27) 19(11.43,-1.27) 20(11.43,1.27)
Top Overlay:
  circle w0.3: c-11.395,-3.135 r0.15
  lines w0.2: -10.16,-2.286 -10.16,-0.508 ; -10.16,0.508 -10.16,2.286 ; -7.62,-2.286 -7.62,-0.508 ; -7.62,0.508 -7.62,2.286 ; -5.08,-2.286 -5.08,-0.508 ; -5.08,0.508 -5.08,2.286 ; -2.54,-2.286 -2.54,-0.508 ; -2.54,0.508 -2.54,2.286 ; 0,-2.286 0,-0.508 ; 0,0.508 0,2.286 ; 2.54,-2.286 2.54,-0.508 ; 2.54,0.508 2.54,2.286 ; 5.08,-2.286 5.08,-0.508 ; 5.08,0.508 5.08,2.286 ; 7.62,-2.286 7.62,-0.508 ; 7.62,0.508 7.62,2.286 ; 10.16,-2.286 10.16,-0.508 ; 10.16,0.508 10.16,2.286 ; -12.7,-2.54 -12.7,2.54 -10.414,2.54 -10.29,2.286 -10.03,2.286 -9.906,2.54 -7.874,2.54 -7.75,2.286 -7.49,2.286 -7.366,2.54 -5.334,2.54 -5.21,2.286 -4.95,2.286 -4.826,2.54 -2.794,2.54 -2.67,2.286 -2.41,2.286 -2.286,2.54 -0.254,2.54 -0.13,2.286 0.13,2.286 0.254,2.54 2.286,2.54 2.41,2.286 2.67,2.286 2.794,2.54 4.826,2.54 4.95,2.286 5.21,2.286 5.334,2.54 7.366,2.54 7.49,2.286 7.75,2.286 7.874,2.54 9.906,2.54 10.03,2.286 10.29,2.286 10.414,2.54 12.7,2.54 12.7,-2.54 10.414,-2.54 10.29,-2.286 10.03,-2.286 9.906,-2.54 7.874,-2.54 7.75,-2.286 7.49,-2.286 7.366,-2.54 5.334,-2.54 5.21,-2.286 4.95,-2.286 4.826,-2.54 2.794,-2.54 2.67,-2.286 2.41,-2.286 2.286,-2.54 0.254,-2.54 0.13,-2.286 -0.13,-2.286 -0.254,-2.54 -2.286,-2.54 -2.41,-2.286 -2.67,-2.286 -2.794,-2.54 -4.826,-2.54 -4.95,-2.286 -5.21,-2.286 -5.334,-2.54 -7.366,-2.54 -7.49,-2.286 -7.75,-2.286 -7.874,-2.54 -9.906,-2.54 -10.03,-2.286 -10.29,-2.286 -10.414,-2.54 -12.7,-2.54 ; -10.414,0 -10.277,0.508 -10.043,0.508 -9.906,0 -10.043,-0.508 -10.277,-0.508 -10.414,0 ; -7.874,0 -7.737,0.508 -7.503,0.508 -7.366,0 -7.503,-0.508 -7.737,-0.508 -7.874,0 ; -5.334,0 -5.197,0.508 -4.963,0.508 -4.826,0 -4.963,-0.508 -5.197,-0.508 -5.334,0 ; -2.794,0 -2.657,0.508 -2.423,0.508 -2.286,0 -2.423,-0.508 -2.657,-0.508 -2.794,0 ; -0.254,0 -0.117,0.508 0.117,0.508 0.254,0 0.117,-0.508 -0.117,-0.508 -0.254,0 ; 2.286,0 2.423,0.508 2.657,0.508 2.794,0 2.657,-0.508 2.423,-0.508 2.286,0 ; 4.826,0 4.963,0.508 5.197,0.508 5.334,0 5.197,-0.508 4.963,-0.508 4.826,0 ; 7.366,0 7.503,0.508 7.737,0.508 7.874,0 7.737,-0.508 7.503,-0.508 7.366,0 ; 9.906,0 10.043,0.508 10.277,0.508 10.414,0 10.277,-0.508 10.043,-0.508 9.906,0